# Altium footprint library 6-Connectors-2.PcbLib: 57 footprints (part 1 of 7)
Each footprint in its own frame and in the unit in brackets; x right, y up, seen from the top. Pads: shape width x height; smd on the part's side, far side on the other; paste and mask are expansions set on the pad; w line width, h text height; cw(c..) or ccw(c..) is an arc to the next point about the centre after c.
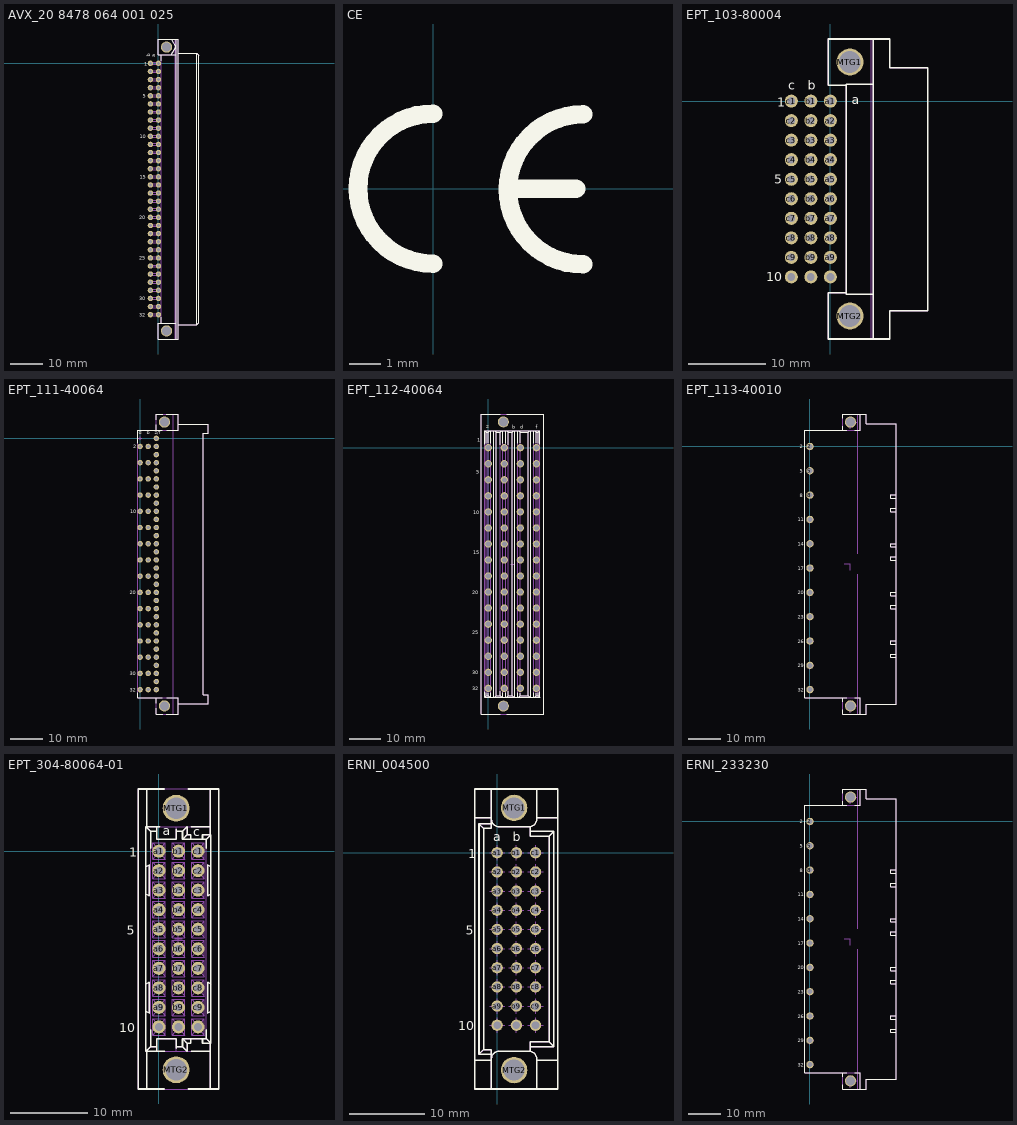
[diagram p0: the footprints below, top view; thin cyan lines are the x and y axes]

## AVX_20 8478 064 001 025 [mm] "DIN 41612, Type Q, Thru-Hole Press-Fit Terminations; Rows a+b, 64 Position, Performance level 2, Lead 5.3mm, Right Angle Female Connector"
height 8
pads (66):
  round 1.7 hole 1: a1(0,0) a2(0,-2.54) a3(0,-5.08) a4(0,-7.62) a5(0,-10.16) a6(0,-12.7) a7(0,-15.24) a8(0,-17.78) a9(0,-20.32) a10(0,-22.86) a11(0,-25.4) a12(0,-27.94) a13(0,-30.48) a14(0,-33.02) a15(0,-35.56) a16(0,-38.1) a17(0,-40.64) a18(0,-43.18) a19(0,-45.72) a20(0,-48.26) a21(0,-50.8) a22(0,-53.34) a23(0,-55.88) a24(0,-58.42) a25(0,-60.96) a26(0,-63.5) a27(0,-66.04) a28(0,-68.58) a29(0,-71.12) a30(0,-73.66) a31(0,-76.2) a32(0,-78.74) b1(-2.54,0) b2(-2.54,-2.54) b3(-2.54,-5.08) b4(-2.54,-7.62) b5(-2.54,-10.16) b6(-2.54,-12.7) b7(-2.54,-15.24) b8(-2.54,-17.78) b9(-2.54,-20.32) b10(-2.54,-22.86) b11(-2.54,-25.4) b12(-2.54,-27.94) b13(-2.54,-30.48) b14(-2.54,-33.02) b15(-2.54,-35.56) b16(-2.54,-38.1) b17(-2.54,-40.64) b18(-2.54,-43.18) b19(-2.54,-45.72) b20(-2.54,-48.26) b21(-2.54,-50.8) b22(-2.54,-53.34) b23(-2.54,-55.88) b24(-2.54,-58.42) b25(-2.54,-60.96) b26(-2.54,-63.5) b27(-2.54,-66.04) b28(-2.54,-68.58) b29(-2.54,-71.12) b30(-2.54,-73.66) b31(-2.54,-76.2) b32(-2.54,-78.74)
  round 3.5 / inner round 3.5 / far side round 5.1 hole 2.8: MTG1(2.54,5.08) MTG2(2.54,-83.82)
Top Overlay:
  lines w0.2: 0.94,-81.37 0.94,-79.564 ; 0.94,0.824 0.94,2.63 ; 3.955,7.63 5.427,5.08 4.012,2.63 ; 5.59,-86.37 5.59,7.63 ; 5.59,-81.37 -0.06,-81.37 -0.06,-86.37 6.19,-86.37 6.19,7.63 -0.06,7.63 -0.06,2.63 5.59,2.63 ; 6.19,-81.87 12.04,-81.87 ; 6.19,3.13 12.04,3.13 ; 12.04,-81.87 12.64,-81.27 12.64,2.53 12.04,3.13 ; 12.04,-81.87 12.04,3.13
  text "1" at -4.505,-0.725 h1.2
  text "b" at -2.65,2.025 h1.2
  text "a" at -0.95,1.99 h1.2
  text "32" at -5.955,-79.365 h1.2
  text "5" at -4.855,-10.785 h1.2
  text "10" at -5.83,-23.535 h1.2
  text "15" at -5.83,-36.235 h1.2
  text "20" at -6.055,-48.81 h1.2
  text "25" at -6,-61.575 h1.2
  text "30" at -5.98,-74.285 h1.2
Mechanical 8:
  drawing of 266 lines, arcs and shapes, not listed
  text "PCB" at 5.08,-41.275 h1.2
Mechanical 14:
  circle w0.1: c2.54,5.08 r1.27
  circle w0.1: c2.54,-83.82 r1.27
  lines w0.1: 0.94,-81.37 0.94,2.63 ; 0.94,-79.04 -2.84,-79.04 -2.84,-78.44 0.94,-78.44 ; 0.94,-76.5 -2.84,-76.5 -2.84,-75.9 0.94,-75.9 ; 0.94,-73.96 -2.84,-73.96 -2.84,-73.36 0.94,-73.36 ; 0.94,-71.42 -2.84,-71.42 -2.84,-70.82 0.94,-70.82 ; 0.94,-68.88 -2.84,-68.88 -2.84,-68.28 0.94,-68.28 ; 0.94,-66.34 -2.84,-66.34 -2.84,-65.74 0.94,-65.74 ; 0.94,-63.8 -2.84,-63.8 -2.84,-63.2 0.94,-63.2 ; 0.94,-61.26 -2.84,-61.26 -2.84,-60.66 0.94,-60.66 ; 0.94,-58.72 -2.84,-58.72 -2.84,-58.12 0.94,-58.12 ; 0.94,-56.18 -2.84,-56.18 -2.84,-55.58 0.94,-55.58 ; 0.94,-53.64 -2.84,-53.64 -2.84,-53.04 0.94,-53.04 ; 0.94,-51.1 -2.84,-51.1 -2.84,-50.5 0.94,-50.5 ; 0.94,-48.56 -2.84,-48.56 -2.84,-47.96 0.94,-47.96 ; 0.94,-46.02 -2.84,-46.02 -2.84,-45.42 0.94,-45.42 ; 0.94,-43.48 -2.84,-43.48 -2.84,-42.88 0.94,-42.88 ; 0.94,-40.94 -2.84,-40.94 -2.84,-40.34 0.94,-40.34 ; 0.94,-38.4 -2.84,-38.4 -2.84,-37.8 0.94,-37.8 ; 0.94,-35.86 -2.84,-35.86 -2.84,-35.26 0.94,-35.26 ; 0.94,-33.32 -2.84,-33.32 -2.84,-32.72 0.94,-32.72 ; 0.94,-30.78 -2.84,-30.78 -2.84,-30.18 0.94,-30.18 ; 0.94,-28.24 -2.84,-28.24 -2.84,-27.64 0.94,-27.64 ; 0.94,-25.7 -2.84,-25.7 -2.84,-25.1 0.94,-25.1 ; 0.94,-23.16 -2.84,-23.16 -2.84,-22.56 0.94,-22.56 ; 0.94,-20.62 -2.84,-20.62 -2.84,-20.02 0.94,-20.02 ; 0.94,-18.08 -2.84,-18.08 -2.84,-17.48 0.94,-17.48 ; 0.94,-15.54 -2.84,-15.54 -2.84,-14.94 0.94,-14.94 ; 0.94,-13 -2.84,-13 -2.84,-12.4 0.94,-12.4 ; 0.94,-10.46 -2.84,-10.46 -2.84,-9.86 0.94,-9.86 ; 0.94,-7.92 -2.84,-7.92 -2.84,-7.32 0.94,-7.32 ; 0.94,-5.38 -2.84,-5.38 -2.84,-4.78 0.94,-4.78 ; 0.94,-2.84 -2.84,-2.84 -2.84,-2.24 0.94,-2.24 ; 0.94,-0.3 -2.84,-0.3 -2.84,0.3 0.94,0.3 ; 3.955,7.63 5.427,5.08 4.012,2.63 ; 5.59,-86.37 5.59,7.63 ; 5.59,-81.37 -0.06,-81.37 -0.06,-86.37 6.19,-86.37 6.19,7.63 -0.06,7.63 -0.06,2.63 5.59,2.63 ; 6.19,-81.87 12.04,-81.87 ; 6.19,3.13 12.04,3.13 ; 12.04,-81.87 12.64,-81.27 12.64,2.53 12.04,3.13 ; 12.04,-81.87 12.04,3.13
  text "a" at -0.95,1.99 h1.2
  text "b" at -2.65,2.025 h1.2
  text "32" at -5.955,-79.365 h1.2
  text "10" at -5.83,-23.535 h1.2
  text "20" at -6.055,-48.81 h1.2
  text "30" at -5.98,-74.285 h1.2
  text "1" at -4.505,-0.725 h1.2
  text "5" at -4.855,-10.785 h1.2
Drill Drawing:
  lines w0.1: 1.73,-57.71 1.73,-80.17 -4.25,-80.17 -4.25,1.43 1.83,1.43 1.83,-19.61
  text "PRESS-FIT TECHNOLOGY diam. 1mm +0.09 -0.06" at 2.8,-56.3 h1
3D body "AVX_20 8478 064 001 025.stp": height 6.78, standoff -5.3, extent -2.84,-86.37 12.64,7.63
3D body "v160-080.stp": height 0.02, standoff -1.65, extent -3.34,-0.8 -1.74,0.8
3D body "v160-080.stp": height 0.02, standoff -1.65, extent -0.8,-0.8 0.8,0.8
3D body "v160-080.stp": height 0.02, standoff -1.65, extent -3.34,-3.34 -1.74,-1.74
3D body "v160-080.stp": height 0.02, standoff -1.65, extent -0.8,-3.34 0.8,-1.74
3D body "v160-080.stp": height 0.02, standoff -1.65, extent -3.34,-5.88 -1.74,-4.28
3D body "v160-080.stp": height 0.02, standoff -1.65, extent -0.8,-5.88 0.8,-4.28
3D body "v160-080.stp": height 0.02, standoff -1.65, extent -3.34,-8.42 -1.74,-6.82
3D body "v160-080.stp": height 0.02, standoff -1.65, extent -0.8,-8.42 0.8,-6.82
3D body "v160-080.stp": height 0.02, standoff -1.65, extent -3.34,-10.96 -1.74,-9.36
3D body "v160-080.stp": height 0.02, standoff -1.65, extent -0.8,-10.96 0.8,-9.36
3D body "v160-080.stp": height 0.02, standoff -1.65, extent -3.34,-13.5 -1.74,-11.9
3D body "v160-080.stp": height 0.02, standoff -1.65, extent -0.8,-13.5 0.8,-11.9
3D body "v160-080.stp": height 0.02, standoff -1.65, extent -3.34,-16.04 -1.74,-14.44
3D body "v160-080.stp": height 0.02, standoff -1.65, extent -0.8,-16.04 0.8,-14.44
3D body "v160-080.stp": height 0.02, standoff -1.65, extent -3.34,-18.58 -1.74,-16.98
3D body "v160-080.stp": height 0.02, standoff -1.65, extent -0.8,-18.58 0.8,-16.98
3D body "v160-080.stp": height 0.02, standoff -1.65, extent -3.34,-21.12 -1.74,-19.52
3D body "v160-080.stp": height 0.02, standoff -1.65, extent -0.8,-21.12 0.8,-19.52
3D body "v160-080.stp": height 0.02, standoff -1.65, extent -3.34,-23.66 -1.74,-22.06
3D body "v160-080.stp": height 0.02, standoff -1.65, extent -0.8,-23.66 0.8,-22.06
3D body "v160-080.stp": height 0.02, standoff -1.65, extent -3.34,-26.2 -1.74,-24.6
3D body "v160-080.stp": height 0.02, standoff -1.65, extent -0.8,-26.2 0.8,-24.6
3D body "v160-080.stp": height 0.02, standoff -1.65, extent -3.34,-28.74 -1.74,-27.14
3D body "v160-080.stp": height 0.02, standoff -1.65, extent -0.8,-28.74 0.8,-27.14
3D body "v160-080.stp": height 0.02, standoff -1.65, extent -3.34,-31.28 -1.74,-29.68
3D body "v160-080.stp": height 0.02, standoff -1.65, extent -0.8,-31.28 0.8,-29.68
3D body "v160-080.stp": height 0.02, standoff -1.65, extent -3.34,-33.82 -1.74,-32.22
3D body "v160-080.stp": height 0.02, standoff -1.65, extent -0.8,-33.82 0.8,-32.22
3D body "v160-080.stp": height 0.02, standoff -1.65, extent -3.34,-36.36 -1.74,-34.76
3D body "v160-080.stp": height 0.02, standoff -1.65, extent -0.8,-36.36 0.8,-34.76
3D body "v160-080.stp": height 0.02, standoff -1.65, extent -3.34,-38.9 -1.74,-37.3
3D body "v160-080.stp": height 0.02, standoff -1.65, extent -0.8,-38.9 0.8,-37.3
3D body "v160-080.stp": height 0.02, standoff -1.65, extent -3.34,-41.44 -1.74,-39.84
3D body "v160-080.stp": height 0.02, standoff -1.65, extent -0.8,-41.44 0.8,-39.84
3D body "v160-080.stp": height 0.02, standoff -1.65, extent -3.34,-43.98 -1.74,-42.38
3D body "v160-080.stp": height 0.02, standoff -1.65, extent -0.8,-43.98 0.8,-42.38
3D body "v160-080.stp": height 0.02, standoff -1.65, extent -3.34,-46.52 -1.74,-44.92
3D body "v160-080.stp": height 0.02, standoff -1.65, extent -0.8,-46.52 0.8,-44.92
3D body "v160-080.stp": height 0.02, standoff -1.65, extent -3.34,-49.06 -1.74,-47.46
3D body "v160-080.stp": height 0.02, standoff -1.65, extent -0.8,-49.06 0.8,-47.46
3D body "v160-080.stp": height 0.02, standoff -1.65, extent -3.34,-51.6 -1.74,-50
3D body "v160-080.stp": height 0.02, standoff -1.65, extent -0.8,-51.6 0.8,-50
3D body "v160-080.stp": height 0.02, standoff -1.65, extent -3.34,-54.14 -1.74,-52.54
3D body "v160-080.stp": height 0.02, standoff -1.65, extent -0.8,-54.14 0.8,-52.54
3D body "v160-080.stp": height 0.02, standoff -1.65, extent -3.34,-56.68 -1.74,-55.08
3D body "v160-080.stp": height 0.02, standoff -1.65, extent -0.8,-56.68 0.8,-55.08
3D body "v160-080.stp": height 0.02, standoff -1.65, extent -3.34,-59.22 -1.74,-57.62
3D body "v160-080.stp": height 0.02, standoff -1.65, extent -0.8,-59.22 0.8,-57.62
3D body "v160-080.stp": height 0.02, standoff -1.65, extent -3.34,-61.76 -1.74,-60.16
3D body "v160-080.stp": height 0.02, standoff -1.65, extent -0.8,-61.76 0.8,-60.16
3D body "v160-080.stp": height 0.02, standoff -1.65, extent -3.34,-64.3 -1.74,-62.7
3D body "v160-080.stp": height 0.02, standoff -1.65, extent -0.8,-64.3 0.8,-62.7
3D body "v160-080.stp": height 0.02, standoff -1.65, extent -3.34,-66.84 -1.74,-65.24
3D body "v160-080.stp": height 0.02, standoff -1.65, extent -0.8,-66.84 0.8,-65.24
3D body "v160-080.stp": height 0.02, standoff -1.65, extent -3.34,-69.38 -1.74,-67.78
3D body "v160-080.stp": height 0.02, standoff -1.65, extent -0.8,-69.38 0.8,-67.78
3D body "v160-080.stp": height 0.02, standoff -1.65, extent -3.34,-71.92 -1.74,-70.32
3D body "v160-080.stp": height 0.02, standoff -1.65, extent -0.8,-71.92 0.8,-70.32
3D body "v160-080.stp": height 0.02, standoff -1.65, extent -3.34,-74.46 -1.74,-72.86
3D body "v160-080.stp": height 0.02, standoff -1.65, extent -0.8,-74.46 0.8,-72.86
3D body "v160-080.stp": height 0.02, standoff -1.65, extent -3.34,-77 -1.74,-75.4
3D body "v160-080.stp": height 0.02, standoff -1.65, extent -0.8,-77 0.8,-75.4
3D body "v160-080.stp": height 0.02, standoff -1.65, extent -3.34,-79.54 -1.74,-77.94
3D body "v160-080.stp": height 0.02, standoff -1.65, extent -0.8,-79.54 0.8,-77.94

## CE [mm]
Top Overlay:
  lines w0.6: 0,-2.413 cw(c0,0) 0,2.413 ; 2.53,0 4.6,0 ; 4.826,-2.438 cw(c4.826,-0.025) 4.826,2.388
3D body "ce.stp": height 0.02, standoff 0, extent -2.725,-2.725 4.82,2.725

## EPT_103-80004 [mm] "Right Angled Connector; DIN 41612, Type C/3, Thru-Hole; Rows a+b+c, 30 Male Contacts"
height 10.95
pads (32):
  round 1.7 hole 1: a1(0,0) a2(0,-2.54) a3(0,-5.08) a4(0,-7.62) a5(0,-10.16) a6(0,-12.7) a7(0,-15.24) a8(0,-17.78) a9(0,-20.32) a10(0,-22.86) b1(-2.54,0) b2(-2.54,-2.54) b3(-2.54,-5.08) b4(-2.54,-7.62) b5(-2.54,-10.16) b6(-2.54,-12.7) b7(-2.54,-15.24) b8(-2.54,-17.78) b9(-2.54,-20.32) b10(-2.54,-22.86) c1(-5.08,0) c2(-5.08,-2.54) c3(-5.08,-5.08) c4(-5.08,-7.62) c5(-5.08,-10.16) c6(-5.08,-12.7) c7(-5.08,-15.24) c8(-5.08,-17.78) c9(-5.08,-20.32) c10(-5.08,-22.86)
  round 3.5 / inner round 3.5 / far side round 5.1 hole 2.8: MTG1(2.54,5.08) MTG2(2.54,-27.94)
Top Overlay:
  lines w0.2: 2.04,-24.93 -0.31,-24.93 -0.31,-30.93 7.74,-30.93 7.74,-27.28 12.64,-27.28 12.64,4.32 7.74,4.32 7.74,8.07 -0.31,8.07 -0.31,2.07 2.04,2.07 ; 5.59,-30.93 5.59,8.07 ; 5.59,-25.14 2.04,-25.14 2.04,2.18 5.59,2.18
  text "b" at -2.94,1.48 h1.2
  text "c" at -5.465,1.48 h1.2
  text "10" at -8.327,-23.435 h1.2
  text "5" at -7.304,-10.76 h1.2
  text "1" at -6.919,-0.725 h1.2
  text "a" at 2.785,-0.395 h1.2
Mechanical 8:
  lines w0.1: -5.58,-22.86 -5.08,-22.86 ; -5.58,-20.32 -5.08,-20.32 ; -5.58,-17.78 -5.08,-17.78 ; -5.58,-15.24 -5.08,-15.24 ; -5.58,-12.7 -5.08,-12.7 ; -5.58,-10.16 -5.08,-10.16 ; -5.58,-7.62 -5.08,-7.62 ; -5.58,-5.08 -5.08,-5.08 ; -5.58,-2.54 -5.08,-2.54 ; -5.58,0 -5.08,0 ; -5.08,-23.36 -5.08,-22.86 ; -5.08,-22.36 -5.08,-22.86 ; -5.08,-20.82 -5.08,-20.32 ; -5.08,-19.82 -5.08,-20.32 ; -5.08,-18.28 -5.08,-17.78 ; -5.08,-17.28 -5.08,-17.78 ; -5.08,-15.74 -5.08,-15.24 ; -5.08,-14.74 -5.08,-15.24 ; -5.08,-13.2 -5.08,-12.7 ; -5.08,-12.2 -5.08,-12.7 ; -5.08,-10.66 -5.08,-10.16 ; -5.08,-9.66 -5.08,-10.16 ; -5.08,-8.12 -5.08,-7.62 ; -5.08,-7.12 -5.08,-7.62 ; -5.08,-5.58 -5.08,-5.08 ; -5.08,-4.58 -5.08,-5.08 ; -5.08,-3.04 -5.08,-2.54 ; -5.08,-2.04 -5.08,-2.54 ; -5.08,-0.5 -5.08,0 ; -5.08,0.5 -5.08,0 ; -4.58,-22.86 -5.08,-22.86 ; -4.58,-20.32 -5.08,-20.32 ; -4.58,-17.78 -5.08,-17.78 ; -4.58,-15.24 -5.08,-15.24 ; -4.58,-12.7 -5.08,-12.7 ; -4.58,-10.16 -5.08,-10.16 ; -4.58,-7.62 -5.08,-7.62 ; -4.58,-5.08 -5.08,-5.08 ; -4.58,-2.54 -5.08,-2.54 ; -4.58,0 -5.08,0 ; -3.04,-22.86 -2.54,-22.86 ; -3.04,-20.32 -2.54,-20.32 ; -3.04,-17.78 -2.54,-17.78 ; -3.04,-15.24 -2.54,-15.24 ; -3.04,-12.7 -2.54,-12.7 ; -3.04,-10.16 -2.54,-10.16 ; -3.04,-7.62 -2.54,-7.62 ; -3.04,-5.08 -2.54,-5.08 ; -3.04,-2.54 -2.54,-2.54 ; -3.04,0 -2.54,0 ; -2.54,-23.36 -2.54,-22.86 ; -2.54,-22.36 -2.54,-22.86 ; -2.54,-20.82 -2.54,-20.32 ; -2.54,-19.82 -2.54,-20.32 ; -2.54,-18.28 -2.54,-17.78 ; -2.54,-17.28 -2.54,-17.78 ; -2.54,-15.74 -2.54,-15.24 ; -2.54,-14.74 -2.54,-15.24 ; -2.54,-13.2 -2.54,-12.7 ; -2.54,-12.2 -2.54,-12.7 ; -2.54,-10.66 -2.54,-10.16 ; -2.54,-9.66 -2.54,-10.16 ; -2.54,-8.12 -2.54,-7.62 ; -2.54,-7.12 -2.54,-7.62 ; -2.54,-5.58 -2.54,-5.08 ; -2.54,-4.58 -2.54,-5.08 ; -2.54,-3.04 -2.54,-2.54 ; -2.54,-2.04 -2.54,-2.54 ; -2.54,-0.5 -2.54,0 ; -2.54,0.5 -2.54,0 ; -2.04,-22.86 -2.54,-22.86 ; -2.04,-20.32 -2.54,-20.32 ; -2.04,-17.78 -2.54,-17.78 ; -2.04,-15.24 -2.54,-15.24 ; -2.04,-12.7 -2.54,-12.7 ; -2.04,-10.16 -2.54,-10.16 ; -2.04,-7.62 -2.54,-7.62 ; -2.04,-5.08 -2.54,-5.08 ; -2.04,-2.54 -2.54,-2.54 ; -2.04,0 -2.54,0 ; -0.5,-22.86 0,-22.86 ; -0.5,-20.32 0,-20.32 ; -0.5,-17.78 0,-17.78 ; -0.5,-15.24 0,-15.24 ; -0.5,-12.7 0,-12.7 ; -0.5,-10.16 0,-10.16 ; -0.5,-7.62 0,-7.62 ; -0.5,-5.08 0,-5.08 ; -0.5,-2.54 0,-2.54 ; -0.5,0 0,0 ; 0,-23.36 0,-22.86 ; 0,-22.36 0,-22.86 ; 0,-20.82 0,-20.32 ; 0,-19.82 0,-20.32 ; 0,-18.28 0,-17.78 ; 0,-17.28 0,-17.78 ; 0,-15.74 0,-15.24 ; 0,-14.74 0,-15.24 ; 0,-13.2 0,-12.7 ; 0,-12.2 0,-12.7 ; 0,-10.66 0,-10.16 ; 0,-9.66 0,-10.16 ; 0,-8.12 0,-7.62 ; 0,-7.12 0,-7.62 ; 0,-5.58 0,-5.08 ; 0,-4.58 0,-5.08 ; 0,-3.04 0,-2.54 ; 0,-2.04 0,-2.54 ; 0,-0.5 0,0 ; 0,0.5 0,0 ; 0.5,-22.86 0,-22.86 ; 0.5,-20.32 0,-20.32 ; 0.5,-17.78 0,-17.78 ; 0.5,-15.24 0,-15.24 ; 0.5,-12.7 0,-12.7 ; 0.5,-10.16 0,-10.16 ; 0.5,-7.62 0,-7.62 ; 0.5,-5.08 0,-5.08 ; 0.5,-2.54 0,-2.54 ; 0.5,0 0,0 ; 2.04,-27.94 2.54,-27.94 ; 2.04,5.08 2.54,5.08 ; 2.54,-28.44 2.54,-27.94 ; 2.54,-27.44 2.54,-27.94 ; 2.54,4.58 2.54,5.08 ; 2.54,5.58 2.54,5.08 ; 3.04,-27.94 2.54,-27.94 ; 3.04,5.08 2.54,5.08 ; 5.3,-30.93 5.3,-11.43 ; 5.3,-30.78 5.3,-11.43 ; 5.3,7.92 5.3,-11.43 ; 5.3,8.07 5.3,-11.43
Mechanical 14:
  circle w0.1: c2.54,5.08 r1.25
  circle w0.1: c2.54,-27.94 r1.25
  lines w0.1: 2.04,-24.93 -0.31,-24.93 -0.31,-30.93 7.74,-30.93 7.74,-27.28 12.64,-27.28 12.64,4.32 7.74,4.32 7.74,8.07 -0.31,8.07 -0.31,2.07 2.04,2.07 ; 5.59,-30.93 5.59,8.07 ; 5.59,-25.14 2.04,-25.14 2.04,2.18 5.59,2.18
  text "b" at -2.94,1.48 h1.2
  text "c" at -5.465,1.48 h1.2
  text "10" at -8.327,-23.435 h1.2
  text "1" at -6.919,-0.725 h1.2
  text "5" at -7.304,-10.76 h1.2
3D body "v160-080.stp": height 0.02, standoff -1.65, extent -0.8,-23.66 0.8,-22.06
3D body "v160-080.stp": height 0.02, standoff -1.65, extent -3.34,-23.66 -1.74,-22.06
3D body "v160-080.stp": height 0.02, standoff -1.65, extent -5.88,-23.66 -4.28,-22.06
3D body "v160-080.stp": height 0.02, standoff -1.65, extent -0.8,-21.12 0.8,-19.52
3D body "v160-080.stp": height 0.02, standoff -1.65, extent -3.34,-21.12 -1.74,-19.52
3D body "v160-080.stp": height 0.02, standoff -1.65, extent -5.88,-21.12 -4.28,-19.52
3D body "v160-080.stp": height 0.02, standoff -1.65, extent -0.8,-18.58 0.8,-16.98
3D body "v160-080.stp": height 0.02, standoff -1.65, extent -3.34,-18.58 -1.74,-16.98
3D body "v160-080.stp": height 0.02, standoff -1.65, extent -5.88,-18.58 -4.28,-16.98
3D body "v160-080.stp": height 0.02, standoff -1.65, extent -0.8,-16.04 0.8,-14.44
3D body "v160-080.stp": height 0.02, standoff -1.65, extent -3.34,-16.04 -1.74,-14.44
3D body "v160-080.stp": height 0.02, standoff -1.65, extent -5.88,-16.04 -4.28,-14.44
3D body "v160-080.stp": height 0.02, standoff -1.65, extent -0.8,-13.5 0.8,-11.9
3D body "v160-080.stp": height 0.02, standoff -1.65, extent -3.34,-13.5 -1.74,-11.9
3D body "v160-080.stp": height 0.02, standoff -1.65, extent -5.88,-13.5 -4.28,-11.9
3D body "v160-080.stp": height 0.02, standoff -1.65, extent -0.8,-10.96 0.8,-9.36
3D body "v160-080.stp": height 0.02, standoff -1.65, extent -3.34,-10.96 -1.74,-9.36
3D body "v160-080.stp": height 0.02, standoff -1.65, extent -5.88,-10.96 -4.28,-9.36
3D body "v160-080.stp": height 0.02, standoff -1.65, extent -0.8,-8.42 0.8,-6.82
3D body "v160-080.stp": height 0.02, standoff -1.65, extent -3.34,-8.42 -1.74,-6.82
3D body "v160-080.stp": height 0.02, standoff -1.65, extent -5.88,-8.42 -4.28,-6.82
3D body "v160-080.stp": height 0.02, standoff -1.65, extent -0.8,-5.88 0.8,-4.28
3D body "v160-080.stp": height 0.02, standoff -1.65, extent -3.34,-5.88 -1.74,-4.28
3D body "v160-080.stp": height 0.02, standoff -1.65, extent -5.88,-5.88 -4.28,-4.28
3D body "v160-080.stp": height 0.02, standoff -1.65, extent -5.88,-3.34 -4.28,-1.74
3D body "v160-080.stp": height 0.02, standoff -1.65, extent -3.34,-3.34 -1.74,-1.74
3D body "v160-080.stp": height 0.02, standoff -1.65, extent -0.8,-3.34 0.8,-1.74
3D body "v160-080.stp": height 0.02, standoff -1.65, extent -0.8,-0.8 0.8,0.8
3D body "v160-080.stp": height 0.02, standoff -1.65, extent -3.34,-0.8 -1.74,0.8
3D body "v160-080.stp": height 0.02, standoff -1.65, extent -5.88,-0.8 -4.28,0.8
3D body "EPT_103-80004.stp": height 9.35, standoff -3, extent -5.38,-30.93 12.64,8.07

## EPT_111-40064 [mm] "DIN 41612, Type G, 64 Contacts, Rows z/f+b+d, Performance level 2, Right Angle Male Connector"
height 16.4
pads (66):
  round 1.7 hole 1: b2(2.54,-2.54) b4(2.54,-7.62) b6(2.54,-12.7) b8(2.54,-17.78) b10(2.54,-22.86) b12(2.54,-27.94) b14(2.54,-33.02) b16(2.54,-38.1) b18(2.54,-43.18) b20(2.54,-48.26) b22(2.54,-53.34) b24(2.54,-58.42) b26(2.54,-63.5) b28(2.54,-68.58) b30(2.54,-73.66) b32(2.54,-78.74) d2(0,-2.54) d4(0,-7.62) d6(0,-12.7) d8(0,-17.78) d10(0,-22.86) d12(0,-27.94) d14(0,-33.02) d16(0,-38.1) d18(0,-43.18) d20(0,-48.26) d22(0,-53.34) d24(0,-58.42) d26(0,-63.5) d28(0,-68.58) d30(0,-73.66) d32(0,-78.74) f2(5.08,0) f4(5.08,-5.08) f6(5.08,-10.16) f8(5.08,-15.24) f10(5.08,-20.32) f12(5.08,-25.4) f14(5.08,-30.48) f16(5.08,-35.56) f18(5.08,-40.64) f20(5.08,-45.72) f22(5.08,-50.8) f24(5.08,-55.88) f26(5.08,-60.96) f28(5.08,-66.04) f30(5.08,-71.12) f32(5.08,-76.2) z2(5.08,-2.54) z4(5.08,-7.62) z6(5.08,-12.7) z8(5.08,-17.78) z10(5.08,-22.86) z12(5.08,-27.94) z14(5.08,-33.02) z16(5.08,-38.1) z18(5.08,-43.18) z20(5.08,-48.26) z22(5.08,-53.34) z24(5.08,-58.42) z26(5.08,-63.5) z28(5.08,-68.58) z30(5.08,-73.66) z32(5.08,-78.74)
  round 3.5 / inner round 3.5 / far side round 5.1 hole 2.8: MTG1(7.62,5.08) MTG2(7.62,-83.82)
Top Overlay:
  lines w0.2: -0.77,-79.725 -0.77,-81.32 5.13,-81.32 ; -0.77,-1.555 -0.77,2.58 5.13,2.58 ; 5.13,-84.568 5.13,-86.37 7.113,-86.37 ; 5.13,-83.072 5.13,-81.32 ; 5.13,4.332 5.13,2.58 ; 5.13,5.828 5.13,7.63 7.113,7.63 ; 6.906,-81.32 5.13,-81.32 ; 6.906,2.58 5.13,2.58 ; 8.127,-86.37 12.03,-86.37 12.03,-83.12 ; 8.127,7.63 12.03,7.63 12.03,4.38 ; 8.334,-81.32 12.03,-81.32 12.03,-83.12 ; 8.334,2.58 12.03,2.58 12.03,4.38 ; 12.03,-83.12 21.33,-83.12 21.33,-80.32 19.83,-80.32 19.83,1.58 21.33,1.58 21.33,4.38 12.03,4.38
  text "30" at -3.203,-74.295 h1.2
  text "10" at -3.06,-23.495 h1.2
  text "32" at -3.203,-79.375 h1.2
  text "b" at 2.047,1.34 h1.2
  text "z/f" at 4.588,1.34 h1.2
  text "d" at -0.493,1.34 h1.2
  text "2" at -2.145,-3.05 h1.2
  text "20" at -3.21,-48.87 h1.2
Mechanical 8:
  drawing of 269 lines, arcs and shapes, not listed
Mechanical 14:
  lines w0.1: 5.13,-81.32 12.03,-81.32 12.03,-83.12 ; 5.13,-81.32 -0.77,-81.32 -0.77,2.58 5.13,2.58 ; 5.13,-81.32 5.13,-86.37 12.03,-86.37 12.03,-83.12 ; 5.13,2.58 12.03,2.58 12.03,4.38 ; 5.13,2.58 5.13,7.63 12.03,7.63 12.03,4.38 ; 12.03,-83.12 21.33,-83.12 21.33,-80.32 19.83,-80.32 19.83,1.58 21.33,1.58 21.33,4.38 12.03,4.38
  text "32" at -3.203,-79.375 h1.2
  text "10" at -3.06,-23.495 h1.2
  text "30" at -3.203,-74.295 h1.2
  text "2" at -2.145,-3.05 h1.2
  text "20" at -3.21,-48.87 h1.2
3D body "EPT_111-40064.stp": height 16.4, standoff -3.4, extent -0.77,-86.37 21.33,7.63
